# Altium footprint library OSHW_LuxonisMaster_20201223.PcbLib: 112 footprints (part 4 of 7)
Each footprint in its own frame and in the unit in brackets; x right, y up, seen from the top. Pads: shape width x height; smd on the part's side, far side on the other; paste and mask are expansions set on the pad; w line width, h text height; cw(c..) or ccw(c..) is an arc to the next point about the centre after c.
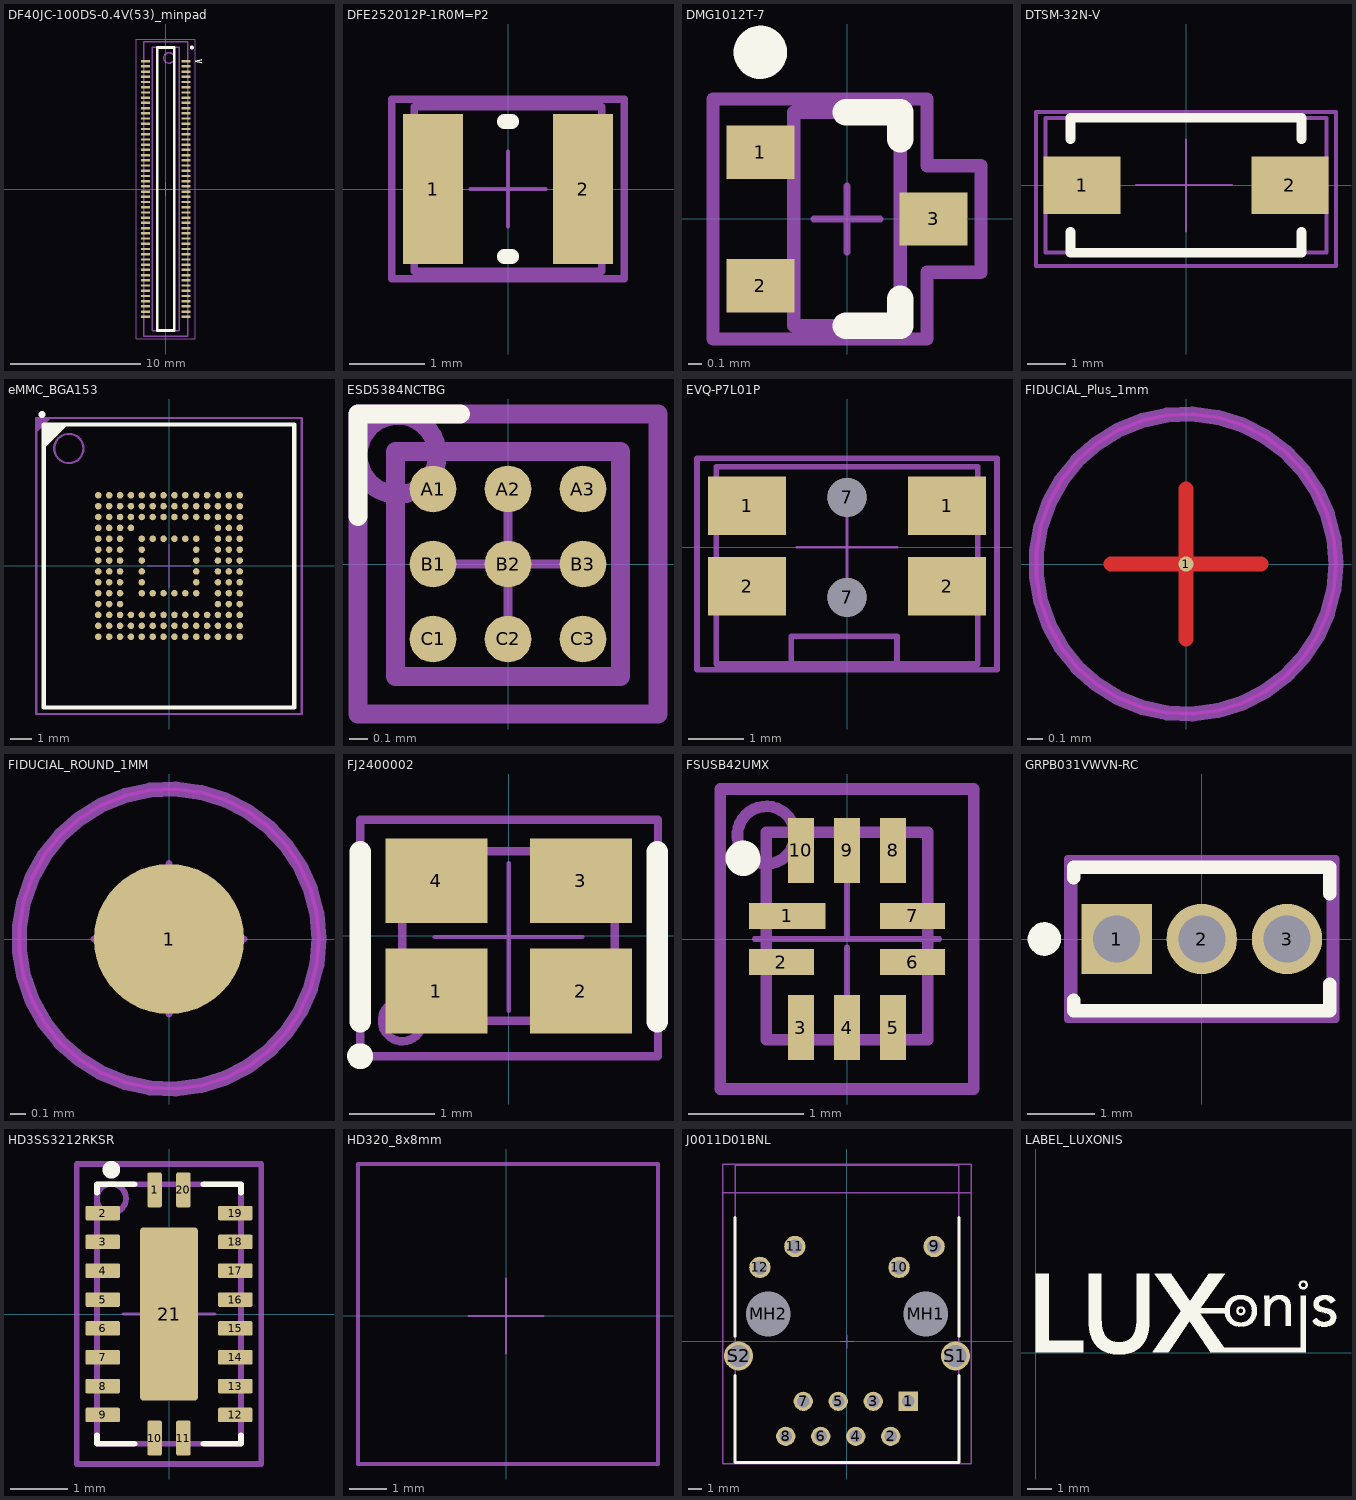
[diagram p3: the footprints below, top view; thin cyan lines are the x and y axes]

## DF40JC-100DS-0.4V(53)_minpad [mm] "2.0MM MATED HEIGHT CONN HDR 100POS 0.4MM SMD GOLD"
height 2.9
pads (100):
  rect 0.7x0.18 smd: 1(1.54,9.8) 2(-1.54,9.8) 3(1.54,9.4) 4(-1.54,9.4) 5(1.54,9) 6(-1.54,9) 7(1.54,8.6) 8(-1.54,8.6) 9(1.54,8.2) 10(-1.54,8.2) 11(1.54,7.8) 12(-1.54,7.8) 13(1.54,7.4) 14(-1.54,7.4) 15(1.54,7) 16(-1.54,7) 17(1.54,6.6) 18(-1.54,6.6) 19(1.54,6.2) 20(-1.54,6.2) 21(1.54,5.8) 22(-1.54,5.8) 23(1.54,5.4) 24(-1.54,5.4) 25(1.54,5) 26(-1.54,5) 27(1.54,4.6) 28(-1.54,4.6) 29(1.54,4.2) 30(-1.54,4.2) 31(1.54,3.8) 32(-1.54,3.8) 33(1.54,3.4) 34(-1.54,3.4) 35(1.54,3) 36(-1.54,3) 37(1.54,2.6) 38(-1.54,2.6) 39(1.54,2.2) 40(-1.54,2.2) 41(1.54,1.8) 42(-1.54,1.8) 43(1.54,1.4) 44(-1.54,1.4) 45(1.54,1) 46(-1.54,1) 47(1.54,0.6) 48(-1.54,0.6) 49(1.54,0.2) 50(-1.54,0.2) 51(1.54,-0.2) 52(-1.54,-0.2) 53(1.54,-0.6) 54(-1.54,-0.6) 55(1.54,-1) 56(-1.54,-1) 57(1.54,-1.4) 58(-1.54,-1.4) 59(1.54,-1.8) 60(-1.54,-1.8) 61(1.54,-2.2) 62(-1.54,-2.2) 63(1.54,-2.6) 64(-1.54,-2.6) 65(1.54,-3) 66(-1.54,-3) 67(1.54,-3.4) 68(-1.54,-3.4) 69(1.54,-3.8) 70(-1.54,-3.8) 71(1.54,-4.2) 72(-1.54,-4.2) 73(1.54,-4.6) 74(-1.54,-4.6) 75(1.54,-5) 76(-1.54,-5) 77(1.54,-5.4) 78(-1.54,-5.4) 79(1.54,-5.8) 80(-1.54,-5.8) 81(1.54,-6.2) 82(-1.54,-6.2) 83(1.54,-6.6) 84(-1.54,-6.6) 85(1.54,-7) 86(-1.54,-7) 87(1.54,-7.4) 88(-1.54,-7.4) 89(1.54,-7.8) 90(-1.54,-7.8) 91(1.54,-8.2) 92(-1.54,-8.2) 93(1.54,-8.6) 94(-1.54,-8.6) 95(1.54,-9) 96(-1.54,-9) 97(1.54,-9.4) 98(-1.54,-9.4) 99(1.54,-9.8) 100(-1.54,-9.8)
Top Overlay:
  circle w0.254: c2,10.85 r0.025
  lines w0.102: 2.75,9.685 2.25,9.8 2.75,9.915
  lines w0.2: -0.65,-10.85 -0.65,10.85 0.65,10.85 0.65,-10.85 -0.65,-10.85
Top Assembly:
  circle w0.1: c0.25,10.05 r0.4
  lines w0.1: -1.05,-10.85 -1.05,10.85 1.05,10.85 1.05,-10.85 -1.05,-10.85
  text "'.Designator'" at 0,0 h1
Top Courtyard:
  lines w0.05: -0.5,0 0.5,0 ; 0,-0.5 0,0.5 ; -2.25,-11.5 2.25,-11.5 2.25,11.5 -2.25,11.5 -2.25,-11.5
Top Component Outline:
  lines w0.1: -1.69,-11.305 1.69,-11.305 1.69,11.295 -1.69,11.295 -1.69,-11.305
3D body: height 17.52, standoff -4, extent 0,0 0,0
3D body: height 2, standoff 0, extent -1.69,-11.305 1.69,11.295

## DFE252012P-1R0M=P2 [mm] "Chip Inductor, 2-Leads, Body 2.40x2.00mm, IPC High Density"
height 1.2
pads (2):
  rect 0.8x2 smd: 1(-1,0) 2(1,0)
Top Overlay:
  lines w0.2: -0.05,-0.9 0.05,-0.9 ; -0.05,0.9 0.05,0.9
Top Assembly:
  lines w0.1: -1.55,-1.2 1.55,-1.2 1.55,1.2 -1.55,1.2 -1.55,-1.2
  text "'.Designator'" at 0,0 h1
Top Courtyard:
  lines w0.05: -0.5,0 0.5,0 ; 0,-0.5 0,0.5 ; -1.55,-1.2 1.55,-1.2 1.55,1.2 -1.55,1.2 -1.55,-1.2
Top Component Outline:
  lines w0.1: -1.25,-1.1 -1.25,1.1 1.25,1.1 1.25,-1.1 -1.25,-1.1
3D body: height 1.2, standoff 0, extent 0.65,-1.1 1.25,1.1
3D body: height 1.2, standoff 0, extent -1.25,-1.1 -0.65,1.1
3D body: height 1.2, standoff 0, extent -0.65,-1.1 0.65,1.1

## DMG1012T-7 [mm] "SOT523, 3-Leads, Body 1.6x0.8mm, Pitch 0.50mm"
height 0.862
pads (3):
  rect 0.51x0.4 smd: 1(-0.65,0.5) 2(-0.65,-0.5) 3(0.65,0)
Top Overlay:
  circle w0.2: c-0.65,1.25 r0.1
  lines w0.2: -0.008,-0.8 0.4,-0.8 0.4,-0.6 ; -0.008,0.8 0.4,0.8 0.4,0.6
Top Assembly:
  lines w0.1: -1.005,-0.9 0.6,-0.9 0.6,-0.4 1.005,-0.4 1.005,0.4 0.6,0.4 0.6,0.9 -1.005,0.9 -1.005,-0.9
  text "'.Designator'" at 0,0 h1
Top Courtyard:
  lines w0.05: -0.25,0 0.25,0 ; 0,-0.25 0,0.25 ; -1.005,-0.9 0.6,-0.9 0.6,-0.4 1.005,-0.4 1.005,0.4 0.6,0.4 0.6,0.9 -1.005,0.9 -1.005,-0.9
Top Component Outline:
  lines w0.1: -0.4,-0.8 0.4,-0.8 0.4,0.8 -0.4,0.8 -0.4,-0.8
3D body: height 0.86, standoff 0, extent -0.4,-0.8 0.4,0.8

## DTSM-32N-V [mm] "tactile button 160gf"
height 5
pads (2):
  rect 2x1.5 smd: 1(-2.7,0) 2(2.7,0)
Top Overlay:
  lines w0.254: -3.005,-1.209 -3,-1.759 3,-1.759 3,-1.209 ; -3.005,1.75 -3,1.191 ; -3,1.75 3,1.75 3,1.191
Top Assembly:
  lines w0.1: -3.9,-2.1 3.9,-2.1 3.9,1.9 -3.9,1.9 -3.9,-2.1
  text "'.Designator'" at 0,0 h1
Top Courtyard:
  lines w0.05: -1.3,0 0,0 ; 0,-1.209 0,0 ; 0,1.191 0,0 ; 1.2,0 0,0 ; -3.9,-2.1 3.9,-2.1 3.9,1.9 -3.9,1.9 -3.9,-2.1
Top Component Outline:
  lines w0.1: -3.65,-1.75 3.65,-1.75 3.65,1.75 -3.65,1.75 -3.65,-1.75
3D body "4341x3.stp": height 5, standoff 0, extent -3.65,-1.75 3.65,1.75

## eMMC_BGA153 [mm] "BGA153_14_14 Generic eMMC part"
height 1
pads (153):
  round 0.3 smd mask-0.025: A1(-3.25,3.25) A2(-2.75,3.25) A3(-2.25,3.25) A4(-1.75,3.25) A5(-1.25,3.25) A6(-0.75,3.25) A7(-0.25,3.25) A8(0.25,3.25) A9(0.75,3.25) A10(1.25,3.25) A11(1.75,3.25) A12(2.25,3.25) A13(2.75,3.25) A14(3.25,3.25) B1(-3.25,2.75) B2(-2.75,2.75) B3(-2.25,2.75) B4(-1.75,2.75) B5(-1.25,2.75) B6(-0.75,2.75) B7(-0.25,2.75) B8(0.25,2.75) B9(0.75,2.75) B10(1.25,2.75) B11(1.75,2.75) B12(2.25,2.75) B13(2.75,2.75) B14(3.25,2.75) C1(-3.25,2.25) C2(-2.75,2.25) C3(-2.25,2.25) C4(-1.75,2.25) C5(-1.25,2.25) C6(-0.75,2.25) C7(-0.25,2.25) C8(0.25,2.25) C9(0.75,2.25) C10(1.25,2.25) C11(1.75,2.25) C12(2.25,2.25) C13(2.75,2.25) C14(3.25,2.25) D1(-3.25,1.75) D2(-2.75,1.75) D3(-2.25,1.75) D4(-1.75,1.75) D12(2.25,1.75) D13(2.75,1.75) D14(3.25,1.75) E1(-3.25,1.25) E2(-2.75,1.25) E3(-2.25,1.25) E5(-1.25,1.25) E6(-0.75,1.25) E7(-0.25,1.25) E8(0.25,1.25) E9(0.75,1.25) E10(1.25,1.25) E12(2.25,1.25) E13(2.75,1.25) E14(3.25,1.25) F1(-3.25,0.75) F2(-2.75,0.75) F3(-2.25,0.75) F5(-1.25,0.75) F10(1.25,0.75) F12(2.25,0.75) F13(2.75,0.75) F14(3.25,0.75) G1(-3.25,0.25) G2(-2.75,0.25) G3(-2.25,0.25) G5(-1.25,0.25) G10(1.25,0.25) G12(2.25,0.25) G13(2.75,0.25) G14(3.25,0.25) H1(-3.25,-0.25) H2(-2.75,-0.25) H3(-2.25,-0.25) H5(-1.25,-0.25) H10(1.25,-0.25) H12(2.25,-0.25) H13(2.75,-0.25) H14(3.25,-0.25) J1(-3.25,-0.75) J2(-2.75,-0.75) J3(-2.25,-0.75) J5(-1.25,-0.75) J10(1.25,-0.75) J12(2.25,-0.75) J13(2.75,-0.75) J14(3.25,-0.75) K1(-3.25,-1.25) K2(-2.75,-1.25) K3(-2.25,-1.25) K5(-1.25,-1.25) K6(-0.75,-1.25) K7(-0.25,-1.25) K8(0.25,-1.25) K9(0.75,-1.25) K10(1.25,-1.25) K12(2.25,-1.25) K13(2.75,-1.25) K14(3.25,-1.25) L1(-3.25,-1.75) L2(-2.75,-1.75) L3(-2.25,-1.75) L12(2.25,-1.75) L13(2.75,-1.75) L14(3.25,-1.75) M1(-3.25,-2.25) M2(-2.75,-2.25) M3(-2.25,-2.25) M4(-1.75,-2.25) M5(-1.25,-2.25) M6(-0.75,-2.25) M7(-0.25,-2.25) M8(0.25,-2.25) M9(0.75,-2.25) M10(1.25,-2.25) M11(1.75,-2.25) M12(2.25,-2.25) M13(2.75,-2.25) M14(3.25,-2.25) N1(-3.25,-2.75) N2(-2.75,-2.75) N3(-2.25,-2.75) N4(-1.75,-2.75) N5(-1.25,-2.75) N6(-0.75,-2.75) N7(-0.25,-2.75) N8(0.25,-2.75) N9(0.75,-2.75) N10(1.25,-2.75) N11(1.75,-2.75) N12(2.25,-2.75) N13(2.75,-2.75) N14(3.25,-2.75) P1(-3.25,-3.25) P2(-2.75,-3.25) P3(-2.25,-3.25) P4(-1.75,-3.25) P5(-1.25,-3.25) P6(-0.75,-3.25) P7(-0.25,-3.25) P8(0.25,-3.25) P9(0.75,-3.25) P10(1.25,-3.25) P11(1.75,-3.25) P12(2.25,-3.25) P13(2.75,-3.25) P14(3.25,-3.25)
Top Overlay:
  circle w0.254: c-5.835,6.957 r0.025
  region: -5.75,5.375 -4.625,6.5 -5.75,6.5
  lines w0.2: -5.75,-6.5 5.75,-6.5 5.75,6.5 -5.75,6.5 -5.75,-6.5
Top Assembly:
  circle w0.1: c-4.6,5.4 r0.671
  region: -6.1,6.119 -5.433,6.786 -5.433,6.817 -6.1,6.817
  lines w0.1: -6.1,-6.8 6.1,-6.8 6.1,6.8 -6.1,6.8 -6.1,-6.8
  text "'.Designator'" at 0,0.188 h1
Top Courtyard:
  lines w0.05: -1,0 0,0 ; 0,-1 0,0 ; 0,1 0,0 ; 1,0 0,0 ; -6.1,-6.8 6.1,-6.8 6.1,6.8 -6.1,6.8 -6.1,-6.8
Top Component Outline:
  lines w0.1: -5.75,-6.5 -5.75,6.5 5.75,6.5 5.75,-6.5 -5.75,-6.5
3D body: height 1, standoff 0.08, extent -5.75,-6.5 5.75,6.5

## ESD5384NCTBG [mm] "9-WLCSP (1.14x1.14)"
height 0.63
pads (9):
  round 0.25 smd: A1(-0.4,0.4) A2(0,0.4) A3(0.4,0.4) B1(-0.4,0) B2(0,0) B3(0.4,0) C1(-0.4,-0.4) C2(0,-0.4) C3(0.4,-0.4)
Top Overlay:
  lines w0.1: -0.8,0.254 -0.8,0.8 -0.254,0.8
Top Assembly:
  circle w0.1: c-0.588,0.581 r0.211
  lines w0.1: -0.8,-0.8 -0.8,0.8 0.8,0.8 0.8,-0.8 -0.8,-0.8
  text "'.Designator'" at 0,0 h1
Top Courtyard:
  lines w0.05: -0.4,0 0,0 ; 0,-0.4 0,0 ; 0,0.4 0,0 ; 0.4,0 0,0 ; -0.8,-0.8 0.8,-0.8 0.8,0.8 -0.8,0.8 -0.8,-0.8
Top Component Outline:
  lines w0.1: -0.6,-0.6 0.6,-0.6 0.6,0.6 -0.6,0.6 -0.6,-0.6
3D body: height 0.63, standoff 0.17, extent -0.603,-0.603 0.603,0.603

## EVQ-P7L01P [mm] "Tactile Switch SPST-NO Side Actuated Surface Mount, Right Angle"
height 1.35
pads (6):
  rect 1.4x1.05 smd: 1(-1.8,0.75) 1(1.8,0.75) 2(-1.8,-0.7) 2(1.8,-0.7)
  round 0.7 hole 0.7 unplated: 7(0,-0.9) 7(0,0.9)
Top Assembly:
  lines w0.1: -0.9,-2.2 -1,-2.2 -1,-1.6 0.9,-1.6 0.9,-2.2 ; 0.9,-2.2 2.7,-2.2 2.7,-1.3 2.7,1.6 -2.7,1.6 -2.7,-2.2 0.9,-2.2
  text "'.Designator'" at 0,0 h1
Top Courtyard:
  lines w0.05: -0.9,0 0,0 ; 0,-0.9 0,0 ; 0,0.9 0,0 ; 0.9,0 0,0 ; -2.7,-2.2 2.7,-2.2 2.7,1.6 -2.7,1.6 -2.7,-2.2
Top Component Outline:
  lines w0.1: -2.35,-2.1 2.35,-2.1 2.35,1.45 -2.35,1.45 -2.35,-2.1
3D body "EVQP7-JA-01P.STEP": height 1.35, standoff 0, extent -2.35,-2.1 2.35,1.45

## FIDUCIAL_Plus_1mm [mm] "Plus sign, 1mm width"
pads (1):
  round 0.1 smd paste-1 mask+0.95: 1(0,0)
Top Layer:
  lines w0.1: -0.5,0 0.5,0 ; 0,-0.5 0,0.5
Top Layer keep-out:
  circle w0.025: c0,0 r1
Top Assembly:
  circle w0.1: c0,0 r1
  text "'.Designator'" at 0,0 h0.75
Top Courtyard:
  circle w0.05: c0,0 r1
  lines w0.05: -0.5,0 0.5,0 ; 0,-0.5 0,0.5

## FIDUCIAL_ROUND_1MM [mm] "Round, 1mm dia"
pads (1):
  round 1 smd paste-1 mask+0.5: 1(0,0)
Top Layer keep-out:
  circle w0.025: c0,0 r1
Top Assembly:
  circle w0.1: c0,0 r1
  text "'.Designator'" at 0,0 h0.75
Top Courtyard:
  circle w0.05: c0,0 r1
  lines w0.05: -0.5,0 0.5,0 ; 0,-0.5 0,0.5

## FJ2400002 [mm] "2.5x2.0mm ceramic SMD"
height 1
pads (4):
  rect 1.2x1 smd: 1(-0.85,-0.65) 2(0.85,-0.65) 3(0.85,0.65) 4(-0.85,0.65)
Top Overlay:
  circle w0.254: c-1.748,-1.416 r0.025
  lines w0.254: -1.748,-1.011 -1.748,0.989 ; 1.752,-1.011 1.752,-0.011 1.752,0.989
Top Assembly:
  circle w0.1: c-1.25,-0.998 r0.242
  lines w0.1: -1.748,-1.416 -1.748,1.37 1.759,1.37 1.759,-1.416 -1.748,-1.416
  text "'.Designator'" at 0,0 h1
Top Courtyard:
  lines w0.05: -1.748,0.989 -1.748,1.37 ; -0.87,-0.011 0,-0.011 ; 0,-0.881 0,-0.011 ; 0,0.859 0,-0.011 ; 0.87,-0.011 0,-0.011 ; -1.748,1.37 -1.748,-1.416 1.759,-1.416 1.759,1.37 -1.748,1.37
Top Component Outline:
  lines w0.1: -1.25,-1 1.25,-1 1.25,1 -1.25,1 -1.25,-1
3D body "User Library-CTS625.STEP": height 1, standoff 0, extent -1.25,-1 1.25,1

## FSUSB42UMX [mm] "USB Switch IC 1 Channel 10-UMLP (1.8x1.4)"
height 0.55
pads (10):
  rect 0.663x0.225 smd: 1(-0.519,0.2)
  rect 0.563x0.225 smd: 2(-0.569,-0.2) 6(0.569,-0.2) 7(0.569,0.2)
  rect 0.225x0.563 smd: 3(-0.4,-0.768) 4(0,-0.768) 5(0.4,-0.768) 8(0.4,0.768) 9(0,0.768) 10(-0.4,0.768)
Top Overlay:
  lines w0.254: -0.879,0.714 ccw(c-0.9,0.7) -0.875,0.7
Top Assembly:
  circle w0.1: c-0.7,0.9 r0.25
  lines w0.1: -1.1,-1.3 -1.1,1.3 1.1,1.3 1.1,-1.3 -1.1,-1.3
  text "'.Designator'" at 0,0 h1
Top Courtyard:
  lines w0.05: -0.8,0 0,0 ; 0,-0.874 0,-0.074 ; 0,0.8 0,0 ; 0.8,0 0,0 ; -1.1,-1.3 1.1,-1.3 1.1,1.3 -1.1,1.3 -1.1,-1.3
Top Component Outline:
  lines w0.1: -0.7,-0.874 0.7,-0.874 0.7,0.926 -0.7,0.926 -0.7,-0.874
3D body: height 0.55, standoff 0.05, extent -0.7,-0.874 0.7,0.926

## GRPB031VWVN-RC [mm] "Header, 3-Leads, Body 3.81x2.14mm, Pitch 1.27mm (SLIN-GRPB031VWVN-RC_V)"
height 4
pads (3):
  rect 1.05x1.05 hole 0.7: 1(-1.27,0)
  round 1.05 hole 0.7: 2(0,0) 3(1.27,0)
Top Overlay:
  circle w0.25: c-2.345,0 r0.125
  lines w0.2: -1.905,-0.91 -1.905,-1.07 1.905,-1.07 1.905,-0.673 ; -1.905,0.91 -1.905,1.07 1.905,1.07 1.905,0.673
Top Assembly:
  circle w0.254: c-2.3,0 r0.025
  lines w0.1: -2,-1.2 2,-1.2 2,1.2 -2,1.2 -2,-1.2
  text "'.Designator'" at 0,0 h1
Top Courtyard:
  lines w0.05: -0.5,0 0.5,0 ; 0,-0.5 0,0.5 ; -2.005,-1.2 -2.005,1.2 2,1.2 2,-1.2 -2.005,-1.2
Top Component Outline:
  lines w0.1: -1.905,-1.07 -1.905,1.07 1.905,1.07 1.905,-1.07 -1.905,-1.07
3D body "_ _ _B031VWVN-RC.STEP": height 4, standoff -2.3, extent -1.905,-1.07 1.905,1.07

## HD3SS3212RKSR [mm] "VQFN-20"
height 1
pads (21):
  rrect20% 0.25x0.6 smd mask+0.07: 1(-0.25,2.15) 10(-0.25,-2.15) 11(0.25,-2.15) 20(0.25,2.15)
  rrect20% 0.6x0.25 smd mask+0.07: 2(-1.15,1.75) 3(-1.15,1.25) 4(-1.15,0.75) 5(-1.15,0.25) 6(-1.15,-0.25) 7(-1.15,-0.75) 8(-1.15,-1.25) 9(-1.15,-1.75) 12(1.15,-1.75) 13(1.15,-1.25) 14(1.15,-0.75) 15(1.15,-0.25) 16(1.15,0.25) 17(1.15,0.75) 18(1.15,1.25) 19(1.15,1.75)
  rrect10% 1x3 smd paste-3 mask+0.07: 21(0,0)
Top Overlay:
  circle w0.254: c-1,2.5 r0.025
  lines w0.1: -1.25,-2.1 -1.25,-2.25 -0.6,-2.25 ; -1.25,2.1 -1.25,2.25 -0.6,2.25 ; 0.6,-2.25 1.25,-2.25 1.25,-2.1 ; 0.6,2.25 1.25,2.25 1.25,2.1
Top Paste:
  region: -0.5,1.3 -0.5,1.32 -0.485,1.357 -0.457,1.385 -0.42,1.4 -0.4,1.4 0.4,1.4 0.42,1.4 0.457,1.385 0.485,1.357 0.5,1.32 0.5,1.3 0.5,0.2 0.5,0.18 0.485,0.143 0.457,0.115 0.42,0.1 0.4,0.1 -0.4,0.1 -0.42,0.1 -0.457,0.115 -0.485,0.143 -0.5,0.18 -0.5,0.2
  region: 0.5,-1.3 0.5,-1.32 0.485,-1.357 0.457,-1.385 0.42,-1.4 0.4,-1.4 -0.4,-1.4 -0.42,-1.4 -0.457,-1.385 -0.485,-1.357 -0.5,-1.32 -0.5,-1.3 -0.5,-0.2 -0.5,-0.18 -0.485,-0.143 -0.457,-0.115 -0.42,-0.1 -0.4,-0.1 0.4,-0.1 0.42,-0.1 0.457,-0.115 0.485,-0.143 0.5,-0.18 0.5,-0.2
Top Assembly:
  circle w0.102: c-1,2.003 r0.254
  lines w0.1: -1.6,-2.6 -1.6,2.6 1.6,2.6 1.6,-2.6 -1.6,-2.6
  text "'.Designator'" at -0.007,0 h1
Assembly Notes:
  text "Based on 0.125 thick stencil" at 0.105,-2.6 h0.5
Top Courtyard:
  lines w0.05: -0.8,0 0,0 ; 0,-0.8 0,0 ; 0,0.8 0,0 ; 0.8,0 0,0 ; -1.6,-2.6 -1.6,2.6 1.6,2.6 1.6,-2.6 -1.6,-2.6
Top Component Outline:
  lines w0.1: -1.25,-2.25 -1.25,2.25 1.25,2.25 1.25,-2.25 -1.25,-2.25
3D body: height 1, standoff 0, extent -1.25,-2.25 1.25,2.25

## HD320_8x8mm [mm] "HD320 TIM 8x8mm 0.5mm thick, uncompressed"
height 0.5
Top Assembly:
  lines w0.1: -3.949,-3.95 4.051,-3.95 4.051,4.05 -3.949,4.05 -3.949,-3.95
  text "'.Designator'" at 0,0 h1
  text "TIM PAD" at -1.75,2 h1
Top Courtyard:
  lines w0.05: -3.949,4.05 -3.949,-3.949 4.052,-3.949 4.052,4.051 -3.949,4.051 ; -1,0 0,0 ; 0,-1 0,0 ; 0,1 0,0 ; 1,0 0,0
Top Component Outline:
  lines w0.1: -3.95,-3.949 -3.95,4.051 ; -3.949,-3.95 4.051,-3.95 ; -3.949,4.051 4.051,4.051 ; 4.052,-3.95 4.052,4.05
3D body: height 1.5, standoff 1, extent -3.95,-3.95 4.052,4.051

## J0011D01BNL [mm] "THD, 12-Leads, Body 21.59x16.26mm, Pitch 1.27mm"
height 13.84
pads (16):
  rect 1.4x1.4 hole 0.89: 1(4.445,-4.355)
  round 1.4 hole 0.89: 2(3.175,-6.895) 3(1.905,-4.355) 4(0.635,-6.895) 5(-0.635,-4.355) 6(-1.905,-6.895) 7(-3.175,-4.355) 8(-4.445,-6.895)
  round 1.55 hole 1.02: 9(6.325,6.895) 10(3.785,5.375) 11(-3.785,6.895) 12(-6.325,5.375)
  round 2.95 hole 3.25: MH1(5.715,1.995) MH2(-5.715,1.995)
  round 2.1 hole 1.6: S1(7.875,-1.055) S2(-7.875,-1.055)
Top Overlay:
  lines w0.2: -8.13,-2.482 -8.13,-8.805 8.13,-8.805 8.13,-2.482 ; -8.13,0.372 -8.13,9 ; 8.13,0.372 8.13,9
Top Assembly:
  lines w0.1: -9.025,10.79 9.025,10.79 ; -9.025,-8.905 -9.025,12.885 9.025,12.885 9.025,-8.905 -9.025,-8.905
  text "'.Designator'" at 0,0 h1
Top Courtyard:
  lines w0.05: -0.5,0 0.5,0 ; 0,-0.5 0,0.5 ; -9.025,-8.905 9.025,-8.905 9.025,12.885 -9.025,12.885 -9.025,-8.905
Top Component Outline:
  lines w0.1: -8.13,-8.805 8.13,-8.805 8.129,-8.805 8.129,12.794 -8.13,12.794 -8.13,12.785 -8.13,-8.805
3D body: height 13.84, standoff 0, extent -8.13,-8.805 8.13,12.785

## LABEL_LUXONIS [mm] "silkscreen/overlay Luxonis label"
Top Overlay:
  drawing of 7 lines, arcs and shapes, not listed